# Altium footprint library Sigma_Library.PcbLib: 125 footprints (part 3 of 8)
Each footprint in its own frame and in the unit in brackets; x right, y up, seen from the top. Pads: shape width x height; smd on the part's side, far side on the other; paste and mask are expansions set on the pad; w line width, h text height; cw(c..) or ccw(c..) is an arc to the next point about the centre after c.
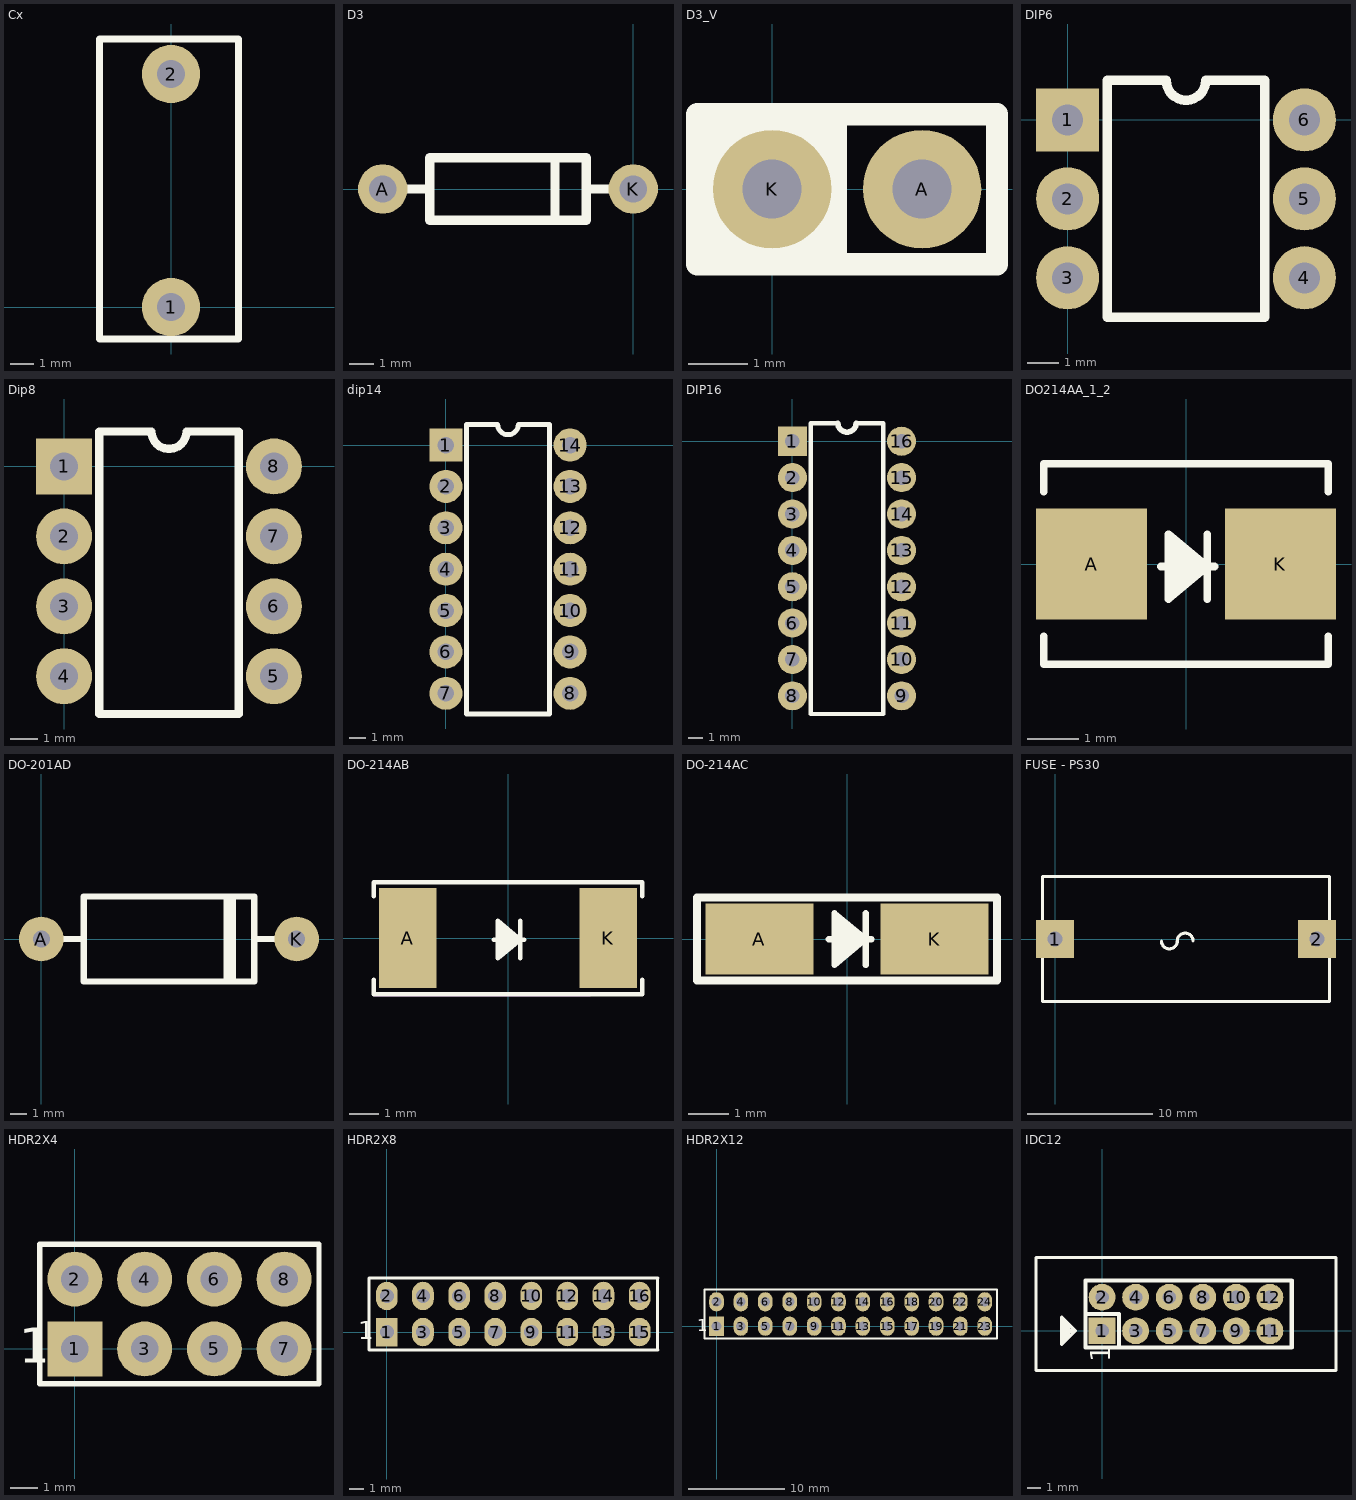
[diagram p2: the footprints below, top view; thin cyan lines are the x and y axes]

## Cx [mm] "CAP_BOX_13x6x14_BL"
pads (2):
  round 2.5 hole 1.2: 1(0,0) 2(0,10)
Top Overlay:
  lines w0.305: -3.073,-1.372 -3.073,11.506 2.896,11.506 2.896,-1.372 -3.073,-1.372
3D body "CAP_BOX_13x6x14_BL.stp": height 14, standoff -2.5, extent -2.974,-1.521 3.025,11.479

## D3 [mil]
pads (2):
  round 79 hole 43.31: A(-400,0) K(0,0)
Top Overlay:
  lines w15: -400,0 -325,0 ; -125,-50 -125,50 ; -75,0 0,0 ; -325,-50 -75,-50 -75,50 -325,50 -325,-50
3D body "DO-204AL-BK.stp": height 110.24, standoff -98.43, extent -415.71,-49.87 15.66,56.43

## D3_V [mil]
pads (2):
  round 79 hole 39.37: A(100,0) K(0,0)
Top Overlay:
  region: 49.98,50.02 -50.02,50.02 -50.02,-49.98 49.98,-49.98
  lines w15: -50,-50 -50,50 150,50 150,-50 -50,-50
3D body "DO-204AL-VA-BK.stp": height 285.42, standoff -98.43, extent -54.39,-62.3 164.39,44

## DIP6 [mil]
pads (6):
  rect 80x80 hole 39.37: 1(0,0)
  round 80 hole 39.37: 2(0,-100) 3(0,-200) 4(300,-200) 5(300,-100) 6(300,0)
Top Overlay:
  lines w12: 50,-250 250,-250 250,50 175,50 cw(c150,50) 125,50 50,50 50,-250
3D body "DIP 6 7_62.stp": height 157.48, standoff -127.95, extent -11.81,-273.23 300,73.23

## Dip8 [mil]
height 21.65
pads (8):
  rect 80x80 hole 40: 1(0,0)
  round 80 hole 40: 2(0,-100) 3(0,-200) 4(0,-300) 5(300,-300) 6(300,-200) 7(300,-100) 8(300,0)
Top Overlay:
  lines w12: 50,-354 50,50 125,50 ccw(c150,50) 175,50 250,50 250,-354 50,-354

## dip14 [mil]
height 21.65
pads (14):
  rect 80x80 hole 40: 1(0,0)
  round 80 hole 40: 2(0,-100) 3(0,-200) 4(0,-300) 5(0,-400) 6(0,-500) 7(0,-600) 8(300,-600) 9(300,-500) 10(300,-400) 11(300,-300) 12(300,-200) 13(300,-100) 14(300,0)
Top Overlay:
  lines w12: 50,-650 50,50 125,50 ccw(c150,50) 175,50 250,50 250,-650 50,-650

## DIP16 [mil]
height 21.65
pads (16):
  rect 80x80 hole 40: 1(0,0)
  round 80 hole 40: 2(0,-100) 3(0,-200) 4(0,-300) 5(0,-400) 6(0,-500) 7(0,-600) 8(0,-700) 9(300,-700) 10(300,-600) 11(300,-500) 12(300,-400) 13(300,-300) 14(300,-200) 15(300,-100) 16(300,0)
Top Overlay:
  lines w12: 125,50 50,50 50,-750 250,-750 250,50 175,50
  lines w15: 125,50 ccw(c150,50) 175,50

## DO214AA_1_2 [mil] "Diode 1N4007"
height 96
pads (2):
  rect 86x86 smd: A(-73,0) K(73,0)
Top Overlay:
  lines w6: -110,-56.1 -110,-77.5 110,-77.5 110,-56.1 ; -110,56.1 -110,77.5 110,77.5 110,56.1 ; -19.29,-1.97 22.05,-1.97 ; -13.54,-21.97 16.46,-1.97 ; -13.54,-16.97 16.46,-1.97 ; -13.54,-11.97 16.46,-1.97 ; -13.54,-6.97 16.46,-1.97 ; -13.54,3.03 16.46,-1.97 ; -13.54,8.03 16.46,-1.97 ; -13.54,13.03 16.46,-1.97 ; -13.54,18.03 16.46,-1.97 ; 16.46,-26.97 16.46,23.03 ; 16.46,-1.97 -13.54,-26.97 -13.54,23.03 16.46,-1.97
3D body "DO-214AA.stp": height 104.33, standoff 0, extent -109.24,-73 111.24,82.51

## DO-201AD [mil]
pads (2):
  round 105 hole 40: A(0,0) K(600,0)
Top Overlay:
  lines w15: 0,0 100,0 ; 435,-100 435,100 ; 450,-100 450,100 ; 500,0 600,0 ; 100,-100 100,100 500,100 500,-100 100,-100
3D body "DO-201AD.STEP": height 220.47, standoff -236.22, extent -25.97,-110.23 625.99,110.25

## DO-214AB [mm]
height 2.438
pads (2):
  rect 1.96x3.39 smd: A(-3.405,0) K(3.405,0)
Top Overlay:
  lines w0.152: -4.572,-1.425 -4.572,-1.905 4.572,-1.905 4.572,-1.425 ; -4.572,1.425 -4.572,1.905 4.572,1.905 4.572,1.425 ; -0.49,-0.05 0.56,-0.05 ; -0.344,-0.558 0.418,-0.05 ; -0.344,-0.431 0.418,-0.05 ; -0.344,-0.304 0.418,-0.05 ; -0.344,-0.177 0.418,-0.05 ; -0.344,0.077 0.418,-0.05 ; -0.344,0.204 0.418,-0.05 ; -0.344,0.331 0.418,-0.05 ; -0.344,0.458 0.418,-0.05 ; 0.418,-0.685 0.418,0.585 ; 0.418,-0.05 -0.344,0.585 -0.344,-0.685 0.418,-0.05
Mechanical 1:
  lines w0: -4.572,-1.968 2.794,-1.968
3D body "DO-214AB.stp": height 2.65, standoff 0, extent -3.9,-3.201 4.25,3.049

## DO-214AC [mm]
pads (2):
  rect 2.65x1.75 smd: A(-2.15,0) K(2.15,0)
Top Overlay:
  lines w0.152: -0.45,-0.004 0.6,-0.004 ; -0.304,-0.512 0.458,-0.004 ; -0.304,-0.385 0.458,-0.004 ; -0.304,-0.258 0.458,-0.004 ; -0.304,-0.131 0.458,-0.004 ; -0.304,0.123 0.458,-0.004 ; -0.304,0.25 0.458,-0.004 ; -0.304,0.377 0.458,-0.004 ; -0.304,0.504 0.458,-0.004 ; 0.458,-0.639 0.458,0.631 ; 0.458,-0.004 -0.304,0.631 -0.304,-0.639 0.458,-0.004
  lines w0.2: -3.683,-1.016 3.683,-1.016 3.683,1.016 -3.683,1.016 -3.683,-1.016
3D body "DO-214AC.stp": height 2.9, standoff 0, extent -2.68,-1.475 2.921,1.475

## FUSE - PS30 [mil]
pads (2):
  rect 120x120 hole 48: 1(0,0) 2(826.77,0)
Top Overlay:
  lines w10: 335.83,-6.3 ccw(c360.83,-6.3) 360.83,-31.3 ccw(c360.83,-6.3) 385.83,-6.3 cw(c410.83,-6.3) 410.83,18.7 cw(c410.83,-6.3) 435.83,-6.3 ; -39.37,-196.85 866.14,-196.85 866.14,196.85 -39.37,196.85 -39.37,-196.85
3D body "FH-102.stp": height 543.3, standoff -200.79, extent -55.5,-172 881.5,182.33

## HDR2X4 [mm] "Connector; Header; 4x2 Position"
pads (8):
  rect 2x2 hole 1: 1(0,0)
  round 2 hole 1: 2(0,2.54) 3(2.54,0) 4(2.54,2.54) 5(5.08,0) 6(5.08,2.54) 7(7.62,0) 8(7.62,2.54)
Top Overlay:
  lines w0.2: -1.27,-1.27 8.89,-1.27 8.89,3.81 -1.27,3.81 -1.27,-1.27
  text "1" at -2.032,-0.508 h1.27
3D body "DS1023-2x4SF11.stp": height 8.5, standoff -3, extent -1.645,-1.266 9.315,3.734

## HDR2X8 [mm] "Connector; Header; 4x2 Position"
pads (16):
  rect 1.524x2 hole 1: 1(0,0)
  oval 1.524x2 hole 1: 2(0,2.54) 3(2.54,0) 4(2.54,2.54) 5(5.08,0) 6(5.08,2.54) 7(7.62,0) 8(7.62,2.54) 9(10.16,0) 10(10.16,2.54) 11(12.7,0) 12(12.7,2.54) 13(15.24,0) 14(15.24,2.54) 15(17.78,0) 16(17.78,2.54)
Top Overlay:
  lines w0.2: 19.05,-1.27 19.05,3.81 ; 19.075,-1.27 -1.27,-1.27 -1.27,3.81 19.075,3.81
  text "1" at -2.032,-0.508 h1.27
3D body "DS1021-2x8SF11.stp": height 8.6, standoff -3, extent -1.245,-1.266 19.075,3.734

## HDR2X12 [mm] "Connector; Header; 12*2 Position"
pads (24):
  rect 1.524x2 hole 1: 1(0,0)
  oval 1.524x2 hole 1: 2(0,2.54) 3(2.54,0) 4(2.54,2.54) 5(5.08,0) 6(5.08,2.54) 7(7.62,0) 8(7.62,2.54) 9(10.16,0) 10(10.16,2.54) 11(12.7,0) 12(12.7,2.54) 13(15.24,0) 14(15.24,2.54) 15(17.78,0) 16(17.78,2.54) 17(20.32,0) 18(20.32,2.54) 19(22.86,0) 20(22.86,2.54) 21(25.4,0) 22(25.4,2.54) 23(27.94,0) 24(27.94,2.54)
Top Overlay:
  lines w0.2: -1.27,-1.27 -1.27,3.81 29.21,3.81 29.21,-1.27 -1.27,-1.27
  text "1" at -2.032,-0.508 h1.27
3D body "DS1021-2x8SF11.stp": height 8.6, standoff -3, extent -1.245,-1.266 19.075,3.734
3D body "DS1021-2x8SF11.stp": height 8.6, standoff -3, extent 8.915,-1.266 29.235,3.734

## IDC12 [mil]
pads (12):
  rect 80x80 hole 40: 1(0,0)
  round 80 hole 40: 2(0,100) 3(100,0) 4(100,100) 5(200,0) 6(200,100) 7(300,0) 8(300,100) 9(400,0) 10(400,100) 11(500,0) 12(500,100)
Top Overlay:
  lines w7.87: -196.85,-118.11 -196.85,218.11 696.85,218.11 696.85,-118.11 -196.85,-118.11
  lines w10: -110,-25 -110,25 ; -100,-15 -100,15 ; -90,-5 -90,5 ; -120,-40 -80,0 -120,40 -120,-40
  lines w12: -50,50 50,50 50,-50 ; -50,-50 -50,150 565,150 565,-50 -50,-50
  text "1" at 25,-94 h60
3D body "2x6 shrouded header v2.step": height 358.27, standoff -110.24, extent -196.6,-121.23 702.61,233.1